# Altium footprint library domino-rising-cage-clamp.PcbLib: 435 footprints (part 3 of 28)
Each footprint in its own frame and in the unit in brackets; x right, y up, seen from the top. Pads: shape width x height; smd on the part's side, far side on the other; paste and mask are expansions set on the pad; w line width, h text height; cw(c..) or ccw(c..) is an arc to the next point about the centre after c.
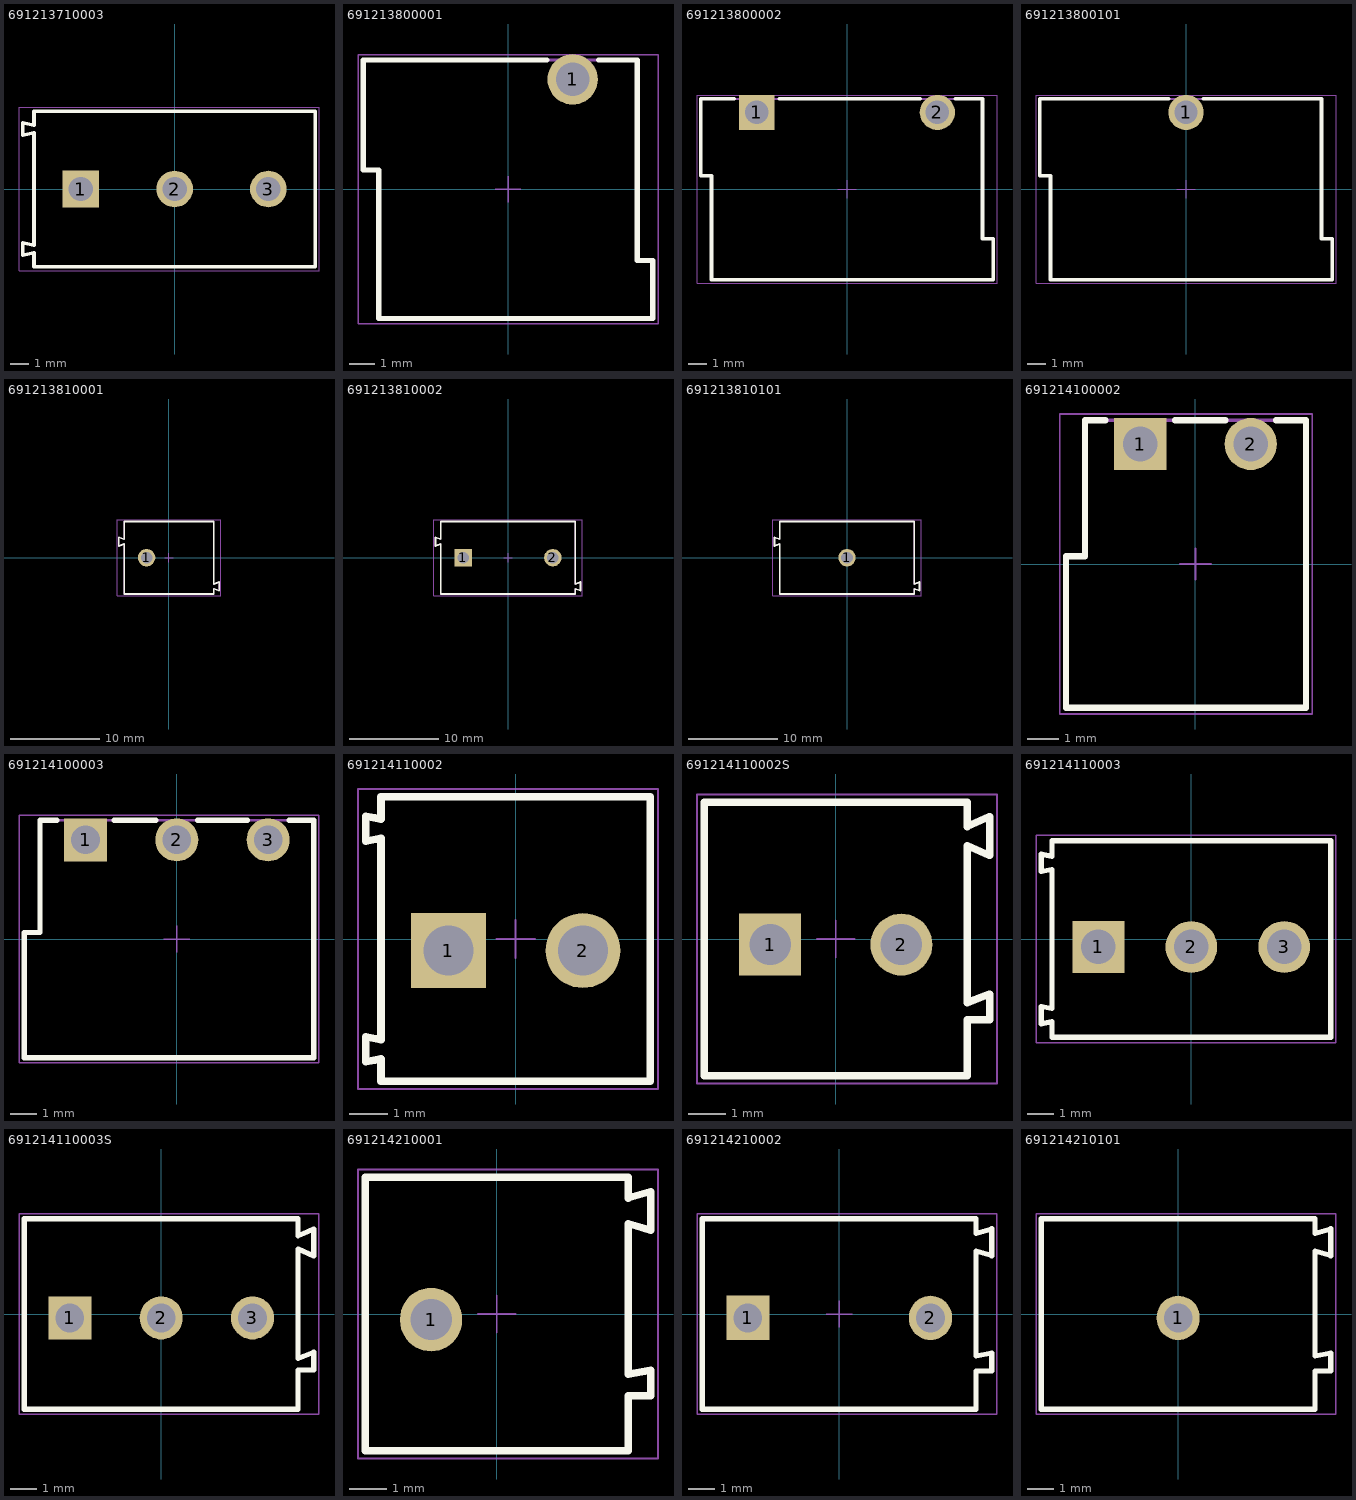
[diagram p2: the footprints below, top view; thin cyan lines are the x and y axes]

## 691213710003 [mm] "5,00mm - modular - green - Horizontal entry with rising cage clamp -  10,0mm height - 03p"
height 10
pads (3):
  rect 1.95x1.95 hole 1.3: 1(-5,0)
  round 1.95 hole 1.3: 2(0,0) 3(5,0)
Top Overlay:
  lines w0.2: -8.1,-3.525 -7.5,-3.4 -7.5,-4.15 7.5,-4.15 7.5,4.15 -7.5,4.15 -7.5,3.4 -8.1,3.525 -8.1,2.875 -7.5,3 -7.5,-3 -8.1,-2.875 -8.1,-3.525
Mechanical 13:
  lines w0.1: -8.1,-3.525 -8.1,-2.875 -7.5,-3 -7.5,3 -8.1,2.875 -8.1,3.525 -7.5,3.4 -7.5,4.15 7.5,4.15 7.5,-4.15 -7.5,-4.15 -7.5,-3.4 -8.1,-3.525
Mechanical 15:
  lines w0.05: -0.5,0 0.5,0 ; 0,-0.5 0,0.5 ; -8.3,-4.35 -8.3,4.35 7.7,4.35 7.7,-4.35 -8.3,-4.35
3D body "691213710003.stp": height 10.05, standoff -3.75, extent -8.1,-4.15 7.5,4.15

## 691213800001 [mm] "Vertical Cable Entry with Rising Cage Clamp, pitch 10mm, 01p"
height 8.1
pads (1):
  round 1.95 hole 1.3: 1(2.5,4.25)
Top Overlay:
  lines w0.2: 1.5,5 -5.6,5 -5.6,0.75 -5,0.75 -5,-5 5.6,-5 5.6,-2.75 5,-2.75 5,5 3.5,5
Mechanical 13:
  lines w0.1: -5.6,0.75 -5.6,5 5,5 5,-2.75 5.6,-2.75 5.6,-5 -5,-5 -5,0.75 -5.6,0.75
Mechanical 15:
  lines w0.05: -0.5,0 0.5,0 ; 0,-0.5 0,0.5 ; -5.8,-5.2 5.8,-5.2 5.8,5.2 -5.8,5.2 -5.8,-5.2
3D body "691213800001.stp": height 8.2, standoff -3.4, extent -5.6,-5 5.6,5

## 691213800002 [mm] "Vertical Cable Entry with Rising Cage Clamp, pitch 10mm, 02p"
height 8.1
pads (2):
  rect 1.95x1.95 hole 1.3: 1(-5,4.25)
  round 1.95 hole 1.3: 2(5,4.25)
Top Overlay:
  lines w0.2: -6.25,5 -8.1,5 -8.1,0.75 -7.5,0.75 -7.5,-5 8.1,-5 8.1,-2.75 7.5,-2.75 7.5,5 6,5 ; -3.75,5 4.05,5
Mechanical 13:
  lines w0.1: -8.1,0.75 -7.5,0.75 -7.5,-5 8.1,-5 8.1,-2.75 7.5,-2.75 7.5,5 -8.1,5 -8.1,0.75
Mechanical 15:
  lines w0.05: -0.5,0 0.5,0 ; 0,-0.5 0,0.5 ; -8.3,-5.2 8.3,-5.2 8.3,5.2 -8.3,5.2 -8.3,-5.2
3D body "691213800002.stp": height 8.2, standoff -3.4, extent -8.1,-5 8.1,5

## 691213800101 [mm] "Vertical Cable Entry with Rising Cage Clamp, pitch 10mm, 01p"
height 8.1
pads (1):
  round 1.95 hole 1.3: 1(0,4.25)
Top Overlay:
  lines w0.2: -0.95,5 -8.1,5 -8.1,0.75 -7.5,0.75 -7.5,-5 8.1,-5 8.1,-2.75 7.5,-2.75 7.5,5 0.95,5
Mechanical 13:
  lines w0.1: -8.1,0.75 -8.1,5 7.5,5 7.5,-2.75 8.1,-2.75 8.1,-5 -7.5,-5 -7.5,0.75 -8.1,0.75
Mechanical 15:
  lines w0.05: -0.5,0 0.5,0 ; 0,-0.5 0,0.5 ; -8.3,-5.2 -8.3,5.2 8.3,5.2 8.3,-5.2 -8.3,-5.2
3D body "691213800101.stp": height 8.2, standoff -3.4, extent -8.1,-5 8.1,5

## 691213810001 [mm] "Horizontal Cable Entry with Rising Cage Clamp, pitch 10mm, 01p"
height 10
pads (1):
  round 1.95 hole 1.3: 1(-2.5,0)
Top Overlay:
  lines w0.2: -5.602,1.294 -5.602,2.294 ccw(c-2.597,8.835) -5,2.05 -5,4.05 5,4.05 ; -5.601,1.291 cw(c-2.502,-5.206) -5.002,1.544 -5.002,-4.048 ; -5,-4.05 5,-4.05 5,-3.45 cw(c2.597,-10.235) 5.602,-3.694 5.602,-2.694 ; 5.002,4.048 5.002,-2.944 ccw(c2.502,3.806) 5.601,-2.691
Mechanical 13:
  lines w0.1: -5.602,1.294 -5.602,2.294 ccw(c-2.597,8.835) -5,2.05 -5,4.05 5,4.05 ; -5.601,1.291 cw(c-2.502,-5.206) -5.002,1.544 -5.002,-4.048 ; -5,-4.05 5,-4.05 5,-3.45 cw(c2.597,-10.235) 5.602,-3.694 5.602,-2.694 ; 5.002,4.048 5.002,-2.944 ccw(c2.502,3.806) 5.601,-2.691
Mechanical 15:
  lines w0.05: -0.5,0 0.5,0 ; 0,-0.5 0,0.5 ; -5.8,-4.25 5.8,-4.25 5.8,4.25 -5.8,4.25 -5.8,-4.25
3D body "691213810001.stp": height 10.14, standoff -3.36, extent -5.6,-4.05 5.6,4.05

## 691213810002 [mm] "Horizontal Cable Entry with Rising Cage Clamp, pitch 10mm, 02p"
height 10
pads (2):
  rect 1.95x1.95 hole 1.3: 1(-5,0)
  round 1.95 hole 1.3: 2(5,0)
Top Overlay:
  lines w0.2: -8.102,1.294 -8.102,2.294 ccw(c-5.097,8.835) -7.5,2.05 -7.5,4.05 7.5,4.05 7.5,-2.944 ccw(c5,3.806) 8.099,-2.691 ; -8.101,1.291 cw(c-5.002,-5.206) -7.502,1.544 ; -7.5,1.544 -7.5,-4.05 7.5,-4.05 7.5,-3.45 ; 7.498,-3.45 cw(c5.095,-10.235) 8.1,-3.694 8.1,-2.694
Mechanical 13:
  lines w0.1: -8.102,1.294 -8.102,2.294 ccw(c-5.097,8.835) -7.5,2.05 -7.5,4.05 7.5,4.05 7.5,-2.944 ccw(c5,3.806) 8.099,-2.691 ; -8.101,1.291 cw(c-5.002,-5.206) -7.502,1.544 ; -7.5,1.544 -7.5,-4.05 7.5,-4.05 7.5,-3.45 ; 7.498,-3.45 cw(c5.095,-10.235) 8.1,-3.694 8.1,-2.694
Mechanical 15:
  lines w0.05: -0.5,0 0.5,0 ; 0,-0.5 0,0.5 ; -8.3,-4.25 -8.3,4.25 8.3,4.25 8.3,-4.25 -8.3,-4.25
3D body "691213810002.stp": height 10.1, standoff -3.4, extent -8.1,-4.05 8.1,4.05

## 691213810101 [mm] "Horizontal Cable Entry with Rising Cage Clamp, pitch 10mm, 01p"
height 10
pads (1):
  round 1.95 hole 1.3: 1(0,0)
Top Overlay:
  lines w0.2: -8.102,1.294 -8.102,2.294 ccw(c-5.097,8.835) -7.5,2.05 -7.5,4.05 7.5,4.05 7.5,-2.944 ccw(c5,3.806) 8.099,-2.691 ; -8.101,1.291 cw(c-5.002,-5.206) -7.502,1.544 ; -7.5,1.544 -7.5,-4.05 7.5,-4.05 7.5,-3.45 ; 7.498,-3.45 cw(c5.095,-10.235) 8.1,-3.694 8.1,-2.694
Mechanical 13:
  lines w0.1: -8.102,1.294 -8.102,2.294 ccw(c-5.097,8.835) -7.5,2.05 -7.5,4.05 7.5,4.05 7.5,-2.944 ccw(c5,3.806) 8.099,-2.691 ; -8.101,1.291 cw(c-5.002,-5.206) -7.502,1.544 ; -7.5,1.544 -7.5,-4.05 7.5,-4.05 7.5,-3.45 ; 7.498,-3.45 cw(c5.095,-10.235) 8.1,-3.694 8.1,-2.694
Mechanical 15:
  lines w0.05: -0.5,0 0.5,0 ; 0,-0.5 0,0.5 ; -8.3,-4.25 -8.3,4.25 8.3,4.25 8.3,-4.25 -8.3,-4.25
3D body "691213810101.stp": height 10.14, standoff -3.36, extent -8.1,-4.05 8.1,4.05

## 691214100002 [mm] "3.50 mm Vertical Entry Modular with Rising Cage Clamp, 2p"
height 7.3
pads (2):
  rect 1.65x1.65 hole 1.1: 1(-1.75,3.8)
  round 1.65 hole 1.1: 2(1.75,3.8)
Top Overlay:
  lines w0.2: -2.85,4.55 -3.5,4.55 -3.5,0.25 -4.1,0.25 -4.1,-4.55 3.5,-4.55 3.5,4.55 2.55,4.55 ; -0.65,4.55 0.95,4.55
Mechanical 13:
  lines w0.1: -4.1,-4.55 3.5,-4.55 3.5,4.55 -3.5,4.55 -3.5,0.25 -4.1,0.25 -4.1,-4.55
Mechanical 15:
  lines w0.05: -0.5,0 0.5,0 ; 0,-0.5 0,0.5 ; -4.3,-4.75 -4.3,4.75 3.7,4.75 3.7,-4.75 -4.3,-4.75
3D body "691214100002.stp": height 7.35, standoff -3.45, extent -4.1,-4.55 3.5,4.55

## 691214100003 [mm] "3.50 mm Vertical Entry Modular with Rising Cage Clamp, 3p"
height 7.3
pads (3):
  rect 1.65x1.65 hole 1.1: 1(-3.5,3.8)
  round 1.65 hole 1.1: 2(0,3.8) 3(3.5,3.8)
Top Overlay:
  lines w0.2: -4.6,4.55 -5.25,4.55 -5.25,0.25 -5.85,0.25 -5.85,-4.55 5.25,-4.55 5.25,4.55 4.3,4.55 ; -2.4,4.55 -0.8,4.55 ; 0.8,4.55 2.7,4.55
Mechanical 13:
  lines w0.1: -5.85,-4.55 5.25,-4.55 5.25,4.55 -5.25,4.55 -5.25,0.25 -5.85,0.25 -5.85,-4.55
Mechanical 15:
  lines w0.05: -0.5,0 0.5,0 ; 0,-0.5 0,0.5 ; -6.05,-4.75 -6.05,4.75 5.45,4.75 5.45,-4.75 -6.05,-4.75
3D body "691214100003.stp": height 7.35, standoff -3.45, extent -5.85,-4.55 5.25,4.55

## 691214110002 [mm] "3.50 mm Horizontal Entry Modular, 2p"
height 8.5
pads (2):
  rect 1.95x1.95 hole 1.3: 1(-1.75,-0.3)
  round 1.95 hole 1.3: 2(1.75,-0.3)
Top Overlay:
  lines w0.2: -3.9,-3.195 -3.5,-3.12 -3.5,-3.7 3.5,-3.7 3.5,3.7 -3.5,3.7 -3.5,3.12 -3.9,3.195 -3.9,2.545 -3.5,2.62 -3.5,-2.62 -3.9,-2.545 -3.9,-3.195
Mechanical 13:
  lines w0.1: -3.9,-3.195 -3.9,-2.545 -3.5,-2.62 -3.5,2.62 -3.9,2.545 -3.9,3.195 -3.5,3.12 -3.5,3.7 3.5,3.7 3.5,-3.7 -3.5,-3.7 -3.5,-3.12 -3.9,-3.195
Mechanical 15:
  lines w0.05: -0.5,0 0.5,0 ; 0,-0.5 0,0.5 ; -4.1,-3.9 3.7,-3.9 3.7,3.9 -4.1,3.9 -4.1,-3.9
3D body "691214110002.stp": height 8.55, standoff -3.65, extent -3.95,-3.7 3.5,3.7

## 691214110002S [mm] "Serie 2141S - 3.50 mm _ 2 pins"
height 9.1
pads (2):
  rect 1.65x1.65 hole 1.1: 1(-1.75,-0.15)
  round 1.65 hole 1.1: 2(1.75,-0.15)
Top Overlay:
  lines w0.2: 4.1,-1.47 4.1,-2.15 3.5,-2.15 3.5,-3.65 -3.5,-3.65 -3.5,3.65 3.5,3.65 3.5,3 4.099,3.262 ; 4.099,-1.468 3.5,-1.7 3.5,2.49 4.099,2.228 ; 4.1,2.23 4.1,3.26
Mechanical 13:
  lines w0.1: 4.1,-1.47 4.1,-2.15 3.5,-2.15 3.5,-3.65 -3.5,-3.65 -3.5,3.65 3.5,3.65 3.5,3 4.099,3.262 ; 4.099,-1.468 3.5,-1.7 3.5,2.49 4.099,2.228 ; 4.1,2.23 4.1,3.26
Mechanical 15:
  lines w0.05: -0.5,0 0.5,0 ; 0,-0.5 0,0.5 ; -3.7,-3.85 -3.7,3.85 4.3,3.85 4.3,-3.85 -3.7,-3.85
3D body "691214110002S.stp": height 9.15, standoff -3.45, extent -3.5,-3.65 4.1,3.65

## 691214110003 [mm] "3.50 mm Horizontal Entry Modular, 3p"
height 8.5
pads (3):
  rect 1.95x1.95 hole 1.3: 1(-3.5,-0.3)
  round 1.95 hole 1.3: 2(0,-0.3) 3(3.5,-0.3)
Top Overlay:
  lines w0.2: -5.65,-3.195 -5.65,-2.545 -5.25,-2.62 -5.25,2.62 -5.65,2.545 -5.65,3.195 -5.25,3.12 -5.25,3.7 5.25,3.7 5.25,-3.7 -5.25,-3.7 -5.25,-3.12 -5.65,-3.195
Mechanical 13:
  lines w0.1: -5.65,-3.195 -5.25,-3.12 -5.25,-3.7 5.25,-3.7 5.25,3.7 -5.25,3.7 -5.25,3.12 -5.65,3.195 -5.65,2.545 -5.25,2.62 -5.25,-2.62 -5.65,-2.545 -5.65,-3.195
Mechanical 15:
  lines w0.05: -0.5,0 0.5,0 ; 0,-0.5 0,0.5 ; -5.85,-3.9 -5.85,3.9 5.45,3.9 5.45,-3.9 -5.85,-3.9
3D body "691214110003.stp": height 8.55, standoff -3.65, extent -5.7,-3.7 5.25,3.7

## 691214110003S [mm] "Serie 2141S - 3.50 mm _ 3 pins"
height 9.1
pads (3):
  rect 1.65x1.65 hole 1.1: 1(-3.5,-0.15)
  round 1.65 hole 1.1: 2(0,-0.15) 3(3.5,-0.15)
Top Overlay:
  lines w0.2: 5.85,-1.47 5.85,-2.15 5.25,-2.15 5.25,-3.65 -5.25,-3.65 -5.25,3.65 5.25,3.65 5.25,3 5.849,3.262 ; 5.849,-1.468 5.25,-1.7 5.25,2.49 5.849,2.228 ; 5.85,2.23 5.85,3.26
Mechanical 13:
  lines w0.1: 5.85,-1.47 5.85,-2.15 5.25,-2.15 5.25,-3.65 -5.25,-3.65 -5.25,3.65 5.25,3.65 5.25,3 5.849,3.262 ; 5.849,-1.468 5.25,-1.7 5.25,2.49 5.849,2.228 ; 5.85,2.23 5.85,3.26
Mechanical 15:
  lines w0.05: -0.5,0 0.5,0 ; 0,-0.5 0,0.5 ; -5.45,-3.85 -5.45,3.85 6.05,3.85 6.05,-3.85 -5.45,-3.85
3D body "691214110003S.stp": height 9.15, standoff -3.45, extent -5.25,-3.65 5.85,3.65

## 691214210001 [mm] "Serie 2142, 7.00 mm, Horizontal Cable Entry with Rising Cage Clamp"
height 9.1
pads (1):
  oval 1.65x1.7 hole 1.1: 1(-1.75,-0.15)
Top Overlay:
  lines w0.2: -3.5,-3.65 3.5,-3.65 3.5,-2.18 4.1,-2.18 4.1,-1.5 3.5,-1.61 3.5,2.41 4.1,2.235 4.1,3.265 3.5,3.09 3.5,3.65 -3.5,3.65 -3.5,-3.65
Mechanical 13:
  lines w0.1: -3.5,-3.65 -3.5,3.65 3.5,3.65 3.5,3.09 4.1,3.265 4.1,2.235 3.5,2.41 3.5,-1.61 4.1,-1.5 4.1,-2.18 3.5,-2.18 3.5,-3.65 -3.5,-3.65
Mechanical 15:
  lines w0.05: -0.5,0 0.5,0 ; 0,-0.5 0,0.5 ; -3.7,-3.85 4.3,-3.85 4.3,3.85 -3.7,3.85 -3.7,-3.85
3D body "691214210001.stp": height 9.2, standoff -3.4, extent -3.5,-3.65 4.1,3.65

## 691214210002 [mm] "Serie 2142, 7.00 mm, Horizontal Cable Entry with Rising Cage Clamp"
height 9.1
pads (2):
  rect 1.65x1.7 hole 1.1: 1(-3.5,-0.15)
  oval 1.65x1.7 hole 1.1: 2(3.5,-0.15)
Top Overlay:
  lines w0.2: -5.25,-3.65 5.25,-3.65 5.25,-2.18 5.85,-2.18 5.85,-1.5 5.25,-1.61 5.25,2.41 5.85,2.235 5.85,3.265 5.25,3.09 5.25,3.65 -5.25,3.65 -5.25,-3.65
Mechanical 13:
  lines w0.1: -5.25,-3.65 -5.25,3.65 5.25,3.65 5.25,3.09 5.85,3.265 5.85,2.235 5.25,2.41 5.25,-1.61 5.85,-1.5 5.85,-2.18 5.25,-2.18 5.25,-3.65 -5.25,-3.65
Mechanical 15:
  lines w0.05: -0.5,0 0.5,0 ; 0,-0.5 0,0.5 ; -5.45,-3.85 6.05,-3.85 6.05,3.85 -5.45,3.85 -5.45,-3.85
3D body "691214210002.stp": height 9.2, standoff -3.4, extent -5.25,-3.65 5.85,3.65

## 691214210101 [mm] "Serie 2142, 7.00 mm, Horizontal Cable Entry with Rising Cage Clamp"
height 9.1
pads (1):
  oval 1.65x1.7 hole 1.1: 1(0,-0.15)
Top Overlay:
  lines w0.2: -5.25,-3.65 -5.25,3.65 5.25,3.65 5.25,3.09 5.85,3.265 5.85,2.235 5.25,2.41 5.25,-1.61 5.85,-1.5 5.85,-2.18 5.25,-2.18 5.25,-3.65 -5.25,-3.65
Mechanical 13:
  lines w0.1: -5.25,-3.65 5.25,-3.65 5.25,-2.18 5.85,-2.18 5.85,-1.5 5.25,-1.61 5.25,2.41 5.85,2.235 5.85,3.265 5.25,3.09 5.25,3.65 -5.25,3.65 -5.25,-3.65
Mechanical 15:
  lines w0.05: -0.5,0 0.5,0 ; 0,-0.5 0,0.5 ; -5.45,-3.85 -5.45,3.85 6.05,3.85 6.05,-3.85 -5.45,-3.85
3D body "691214210101.stp": height 9.2, standoff -3.4, extent -5.25,-3.65 5.85,3.65